# Altium schematic symbol library con-molex.SCHLIB: 368 symbols (part 1 of 6) (continued)
## 53?-13398
designator X?, comment CONNECTOR   wire to board 1.25 mm (.049 inch) pitch header
OC_FARNELL: unknown; OC_NEWARK: unknown
footprint 53398-13
part A pins: 1 S
part B pins: 2 S
part C pins: 3 S
part D pins: 4 S
part E pins: 5 S
part F pins: 6 S
part G pins: 7 S
part H pins: 8 S
part I pins: 9 S
part J pins: 10 S
part K pins: 11 S
part L pins: 12 S
part M pins: 13 S

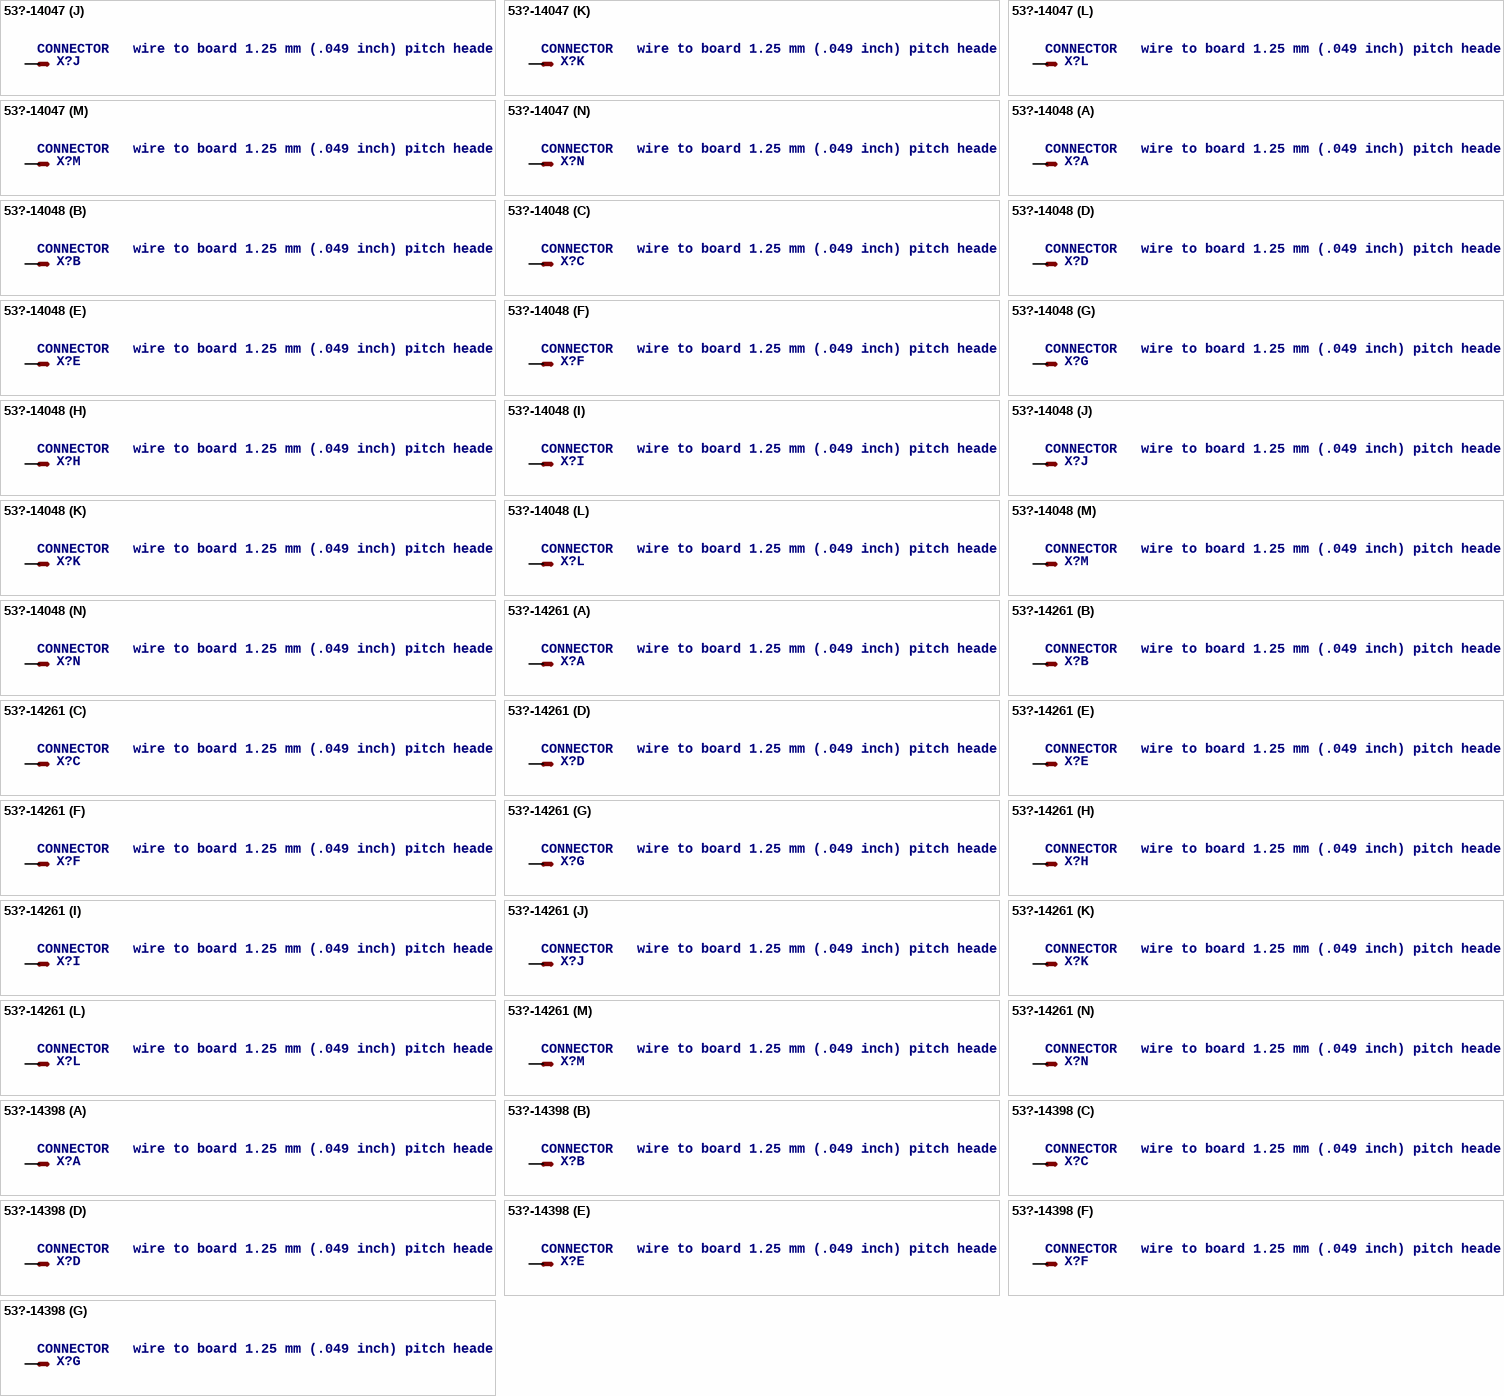
[diagram p15: symbols 53?-14047 to 53?-14398]

## 53?-14047
designator X?, comment CONNECTOR   wire to board 1.25 mm (.049 inch) pitch header
MPN: 53047-1410; OC_FARNELL: 9732900; OC_NEWARK: 98K9830
footprint 53047-14
part A pins: 1 S
part B pins: 2 S
part C pins: 3 S
part D pins: 4 S
part E pins: 5 S
part F pins: 6 S
part G pins: 7 S
part H pins: 8 S
part I pins: 9 S
part J pins: 10 S
part K pins: 11 S
part L pins: 12 S
part M pins: 13 S
part N pins: 14 S

## 53?-14048
designator X?, comment CONNECTOR   wire to board 1.25 mm (.049 inch) pitch header
MPN: 53048-1410; OC_FARNELL: 1012240; OC_NEWARK: 98K9839
footprint 53048-14
part A pins: 1 S
part B pins: 2 S
part C pins: 3 S
part D pins: 4 S
part E pins: 5 S
part F pins: 6 S
part G pins: 7 S
part H pins: 8 S
part I pins: 9 S
part J pins: 10 S
part K pins: 11 S
part L pins: 12 S
part M pins: 13 S
part N pins: 14 S

## 53?-14261
designator X?, comment CONNECTOR   wire to board 1.25 mm (.049 inch) pitch header
OC_FARNELL: 1125364; OC_NEWARK: unknown
footprint 53261-14
part A pins: 1 S
part B pins: 2 S
part C pins: 3 S
part D pins: 4 S
part E pins: 5 S
part F pins: 6 S
part G pins: 7 S
part H pins: 8 S
part I pins: 9 S
part J pins: 10 S
part K pins: 11 S
part L pins: 12 S
part M pins: 13 S
part N pins: 14 S

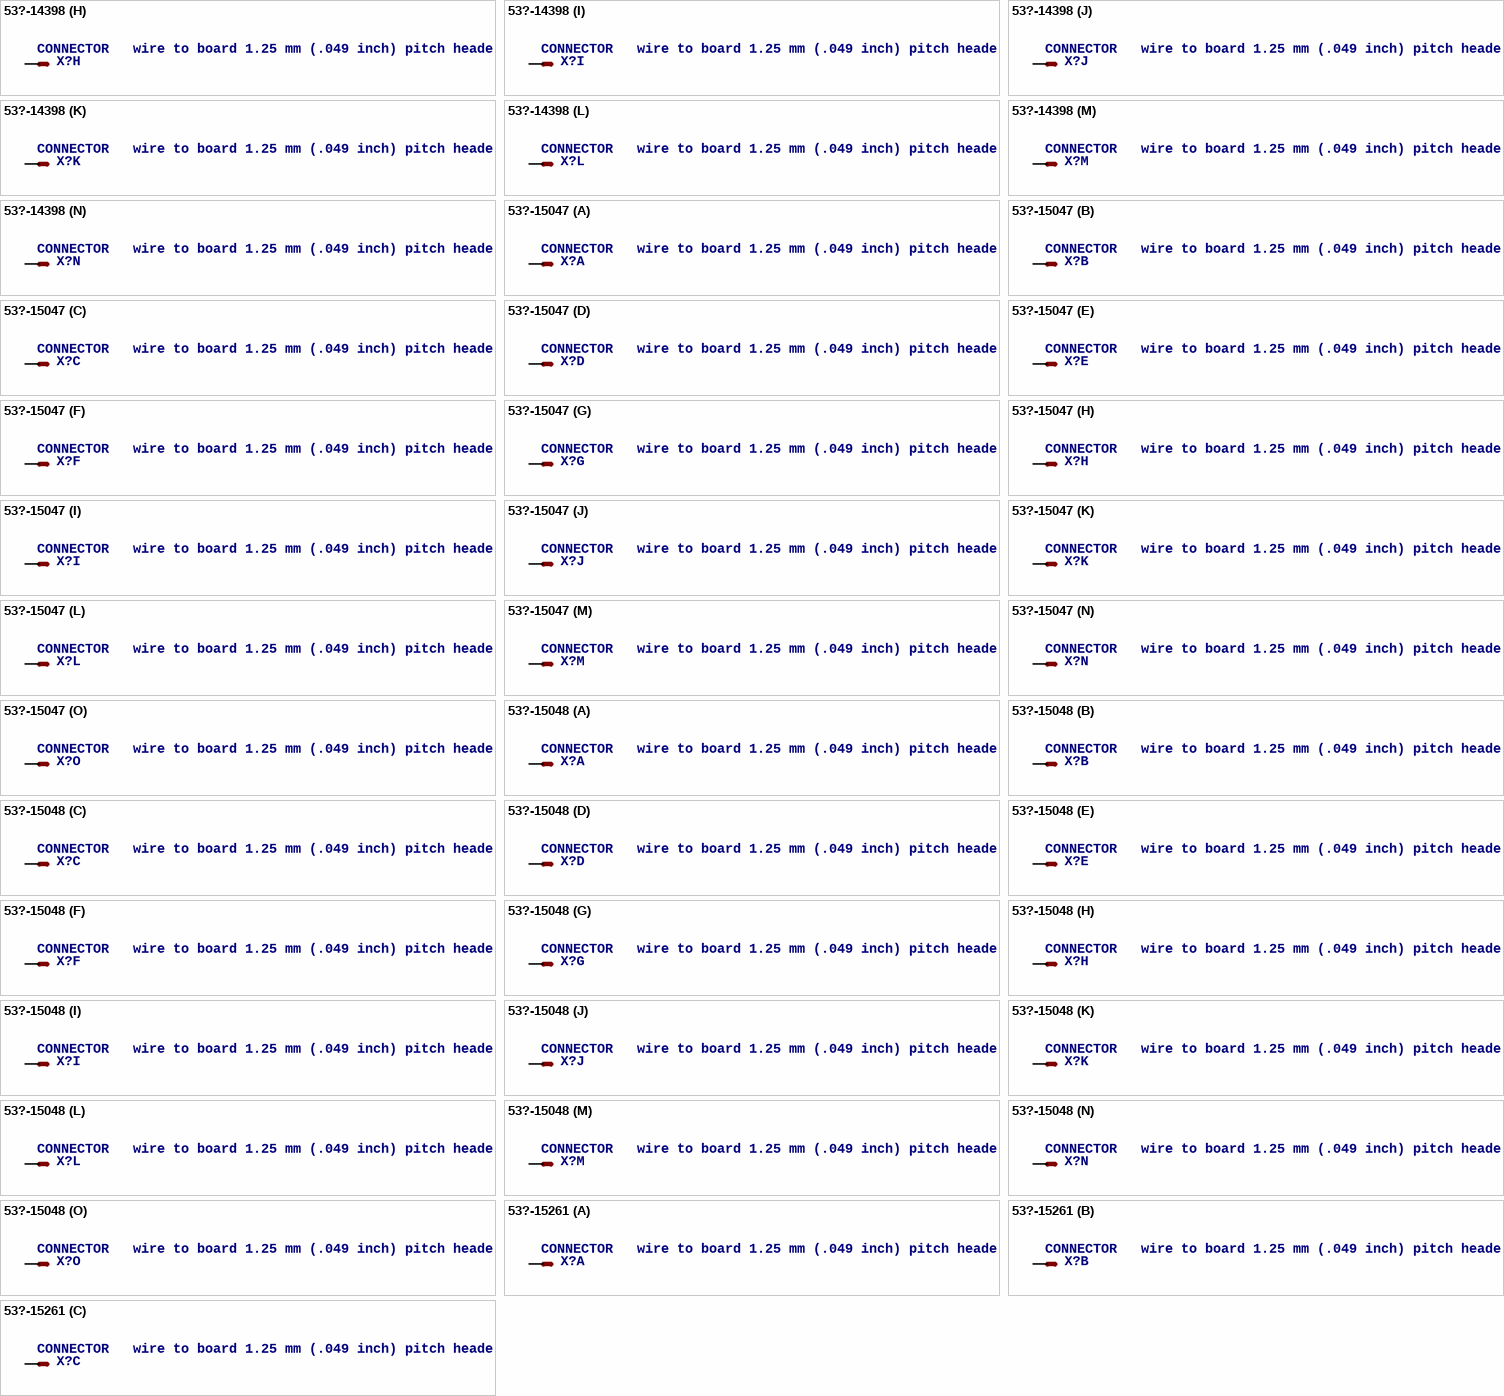
[diagram p16: symbols 53?-14398 to 53?-15261]

## 53?-14398
designator X?, comment CONNECTOR   wire to board 1.25 mm (.049 inch) pitch header
OC_FARNELL: 9786384; OC_NEWARK: unknown
footprint 53398-14
part A pins: 1 S
part B pins: 2 S
part C pins: 3 S
part D pins: 4 S
part E pins: 5 S
part F pins: 6 S
part G pins: 7 S
part H pins: 8 S
part I pins: 9 S
part J pins: 10 S
part K pins: 11 S
part L pins: 12 S
part M pins: 13 S
part N pins: 14 S

## 53?-15047
designator X?, comment CONNECTOR   wire to board 1.25 mm (.049 inch) pitch header
MPN: 53047-1510-C; OC_FARNELL: unknown; OC_NEWARK: 79K4146
footprint 53047-15
part A pins: 1 S
part B pins: 2 S
part C pins: 3 S
part D pins: 4 S
part E pins: 5 S
part F pins: 6 S
part G pins: 7 S
part H pins: 8 S
part I pins: 9 S
part J pins: 10 S
part K pins: 11 S
part L pins: 12 S
part M pins: 13 S
part N pins: 14 S
part O pins: 15 S

## 53?-15048
designator X?, comment CONNECTOR   wire to board 1.25 mm (.049 inch) pitch header
MPN: 53048-1510; OC_FARNELL: 9732942; OC_NEWARK: 98K9840
footprint 53048-15
part A pins: 1 S
part B pins: 2 S
part C pins: 3 S
part D pins: 4 S
part E pins: 5 S
part F pins: 6 S
part G pins: 7 S
part H pins: 8 S
part I pins: 9 S
part J pins: 10 S
part K pins: 11 S
part L pins: 12 S
part M pins: 13 S
part N pins: 14 S
part O pins: 15 S

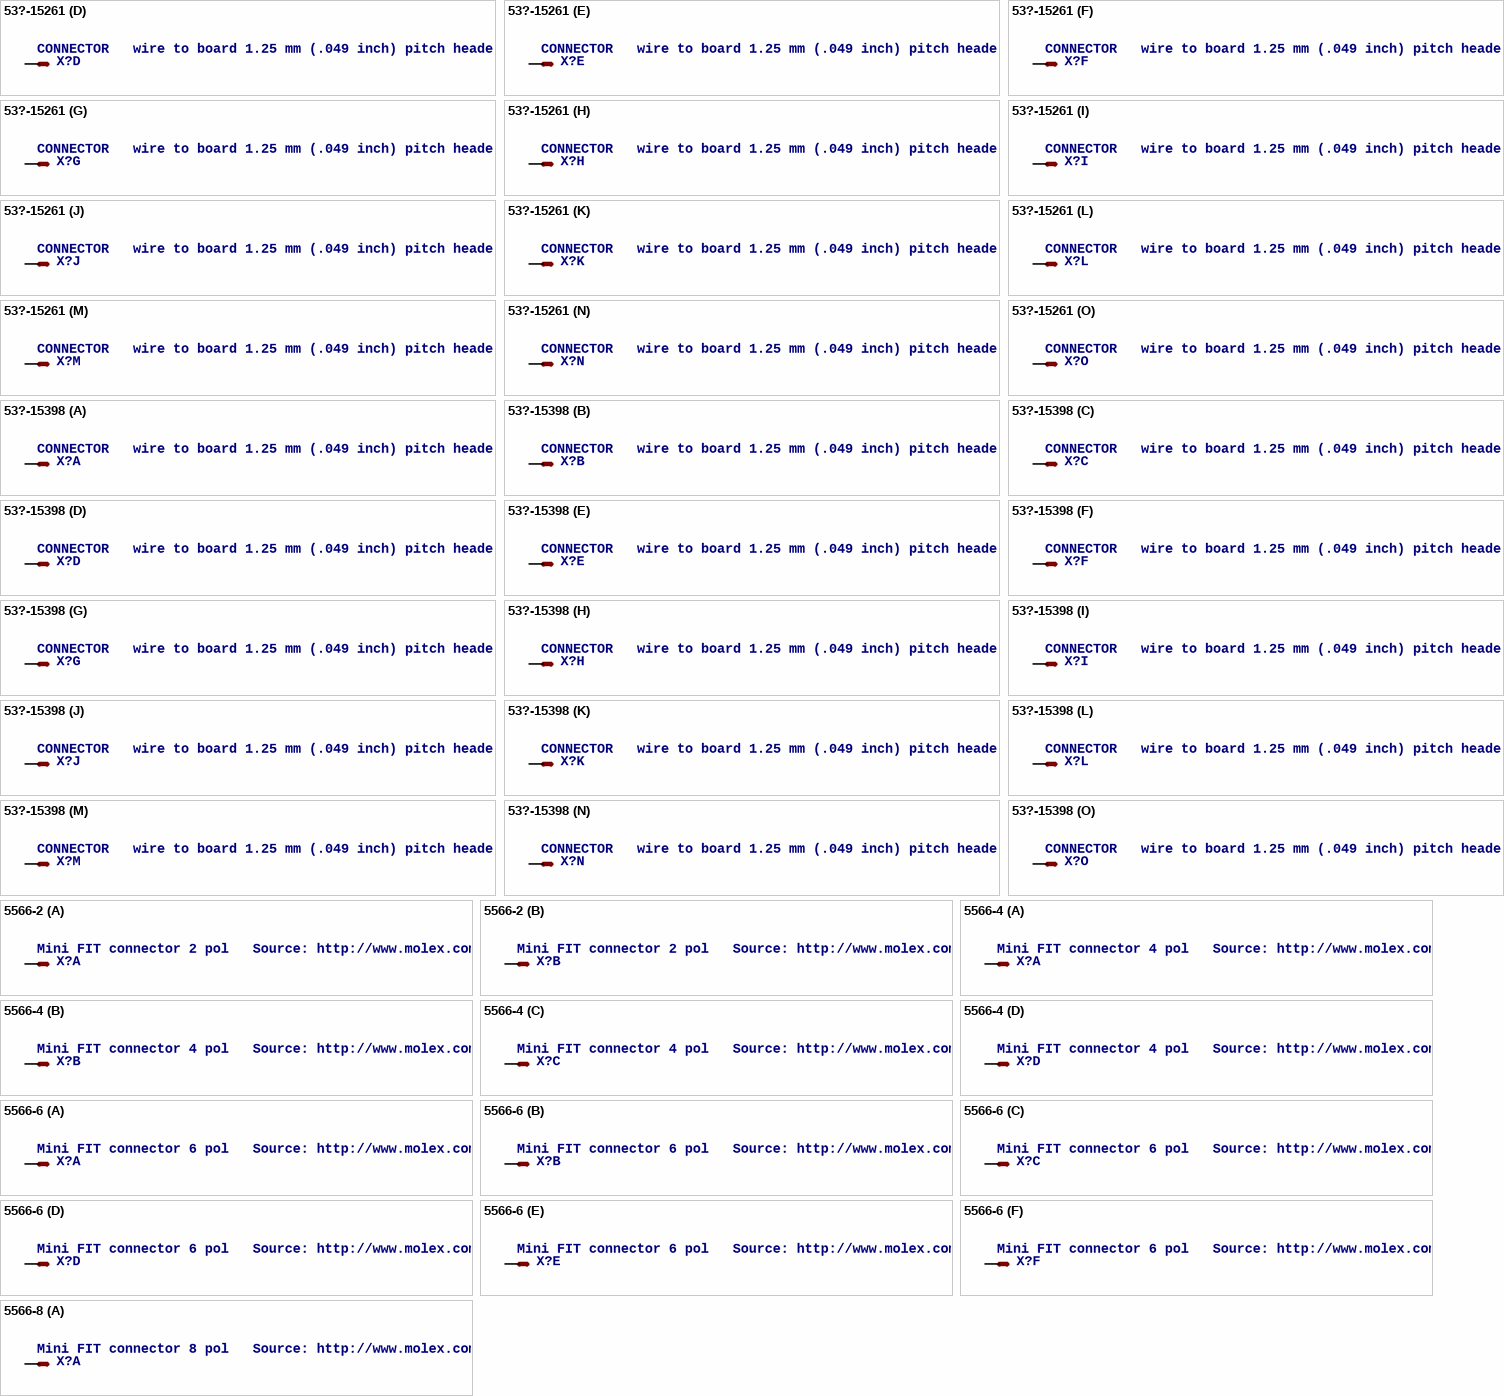
[diagram p17: symbols 53?-15261 to 5566-8]

## 53?-15261
designator X?, comment CONNECTOR   wire to board 1.25 mm (.049 inch) pitch header
OC_FARNELL: 1125365; OC_NEWARK: unknown
footprint 53261-15
part A pins: 1 S
part B pins: 2 S
part C pins: 3 S
part D pins: 4 S
part E pins: 5 S
part F pins: 6 S
part G pins: 7 S
part H pins: 8 S
part I pins: 9 S
part J pins: 10 S
part K pins: 11 S
part L pins: 12 S
part M pins: 13 S
part N pins: 14 S
part O pins: 15 S

## 53?-15398
designator X?, comment CONNECTOR   wire to board 1.25 mm (.049 inch) pitch header
MPN: 53398-1590; MF: MOLEX; OC_FARNELL: 1125358; OC_NEWARK: 57H5433
footprint 53398-15
part A pins: 1 S
part B pins: 2 S
part C pins: 3 S
part D pins: 4 S
part E pins: 5 S
part F pins: 6 S
part G pins: 7 S
part H pins: 8 S
part I pins: 9 S
part J pins: 10 S
part K pins: 11 S
part L pins: 12 S
part M pins: 13 S
part N pins: 14 S
part O pins: 15 S

## 5566-2
designator X?, comment Mini FIT connector 2 pol   Source: http://www.molex.com
OC_FARNELL: 1822072; OC_NEWARK: unknown
footprint 5566-2
part A pins: 1 S
part B pins: 2 S

## 5566-4
designator X?, comment Mini FIT connector 4 pol   Source: http://www.molex.com
OC_FARNELL: unknown; OC_NEWARK: unknown
footprint 5566-4
part A pins: 1 S
part B pins: 2 S
part C pins: 3 S
part D pins: 4 S

## 5566-6
designator X?, comment Mini FIT connector 6 pol   Source: http://www.molex.com
MPN: 95566-61002; OC_FARNELL: unknown; OC_NEWARK: 22K8620
footprint 5566-6
part A pins: 1 S
part B pins: 2 S
part C pins: 3 S
part D pins: 4 S
part E pins: 5 S
part F pins: 6 S

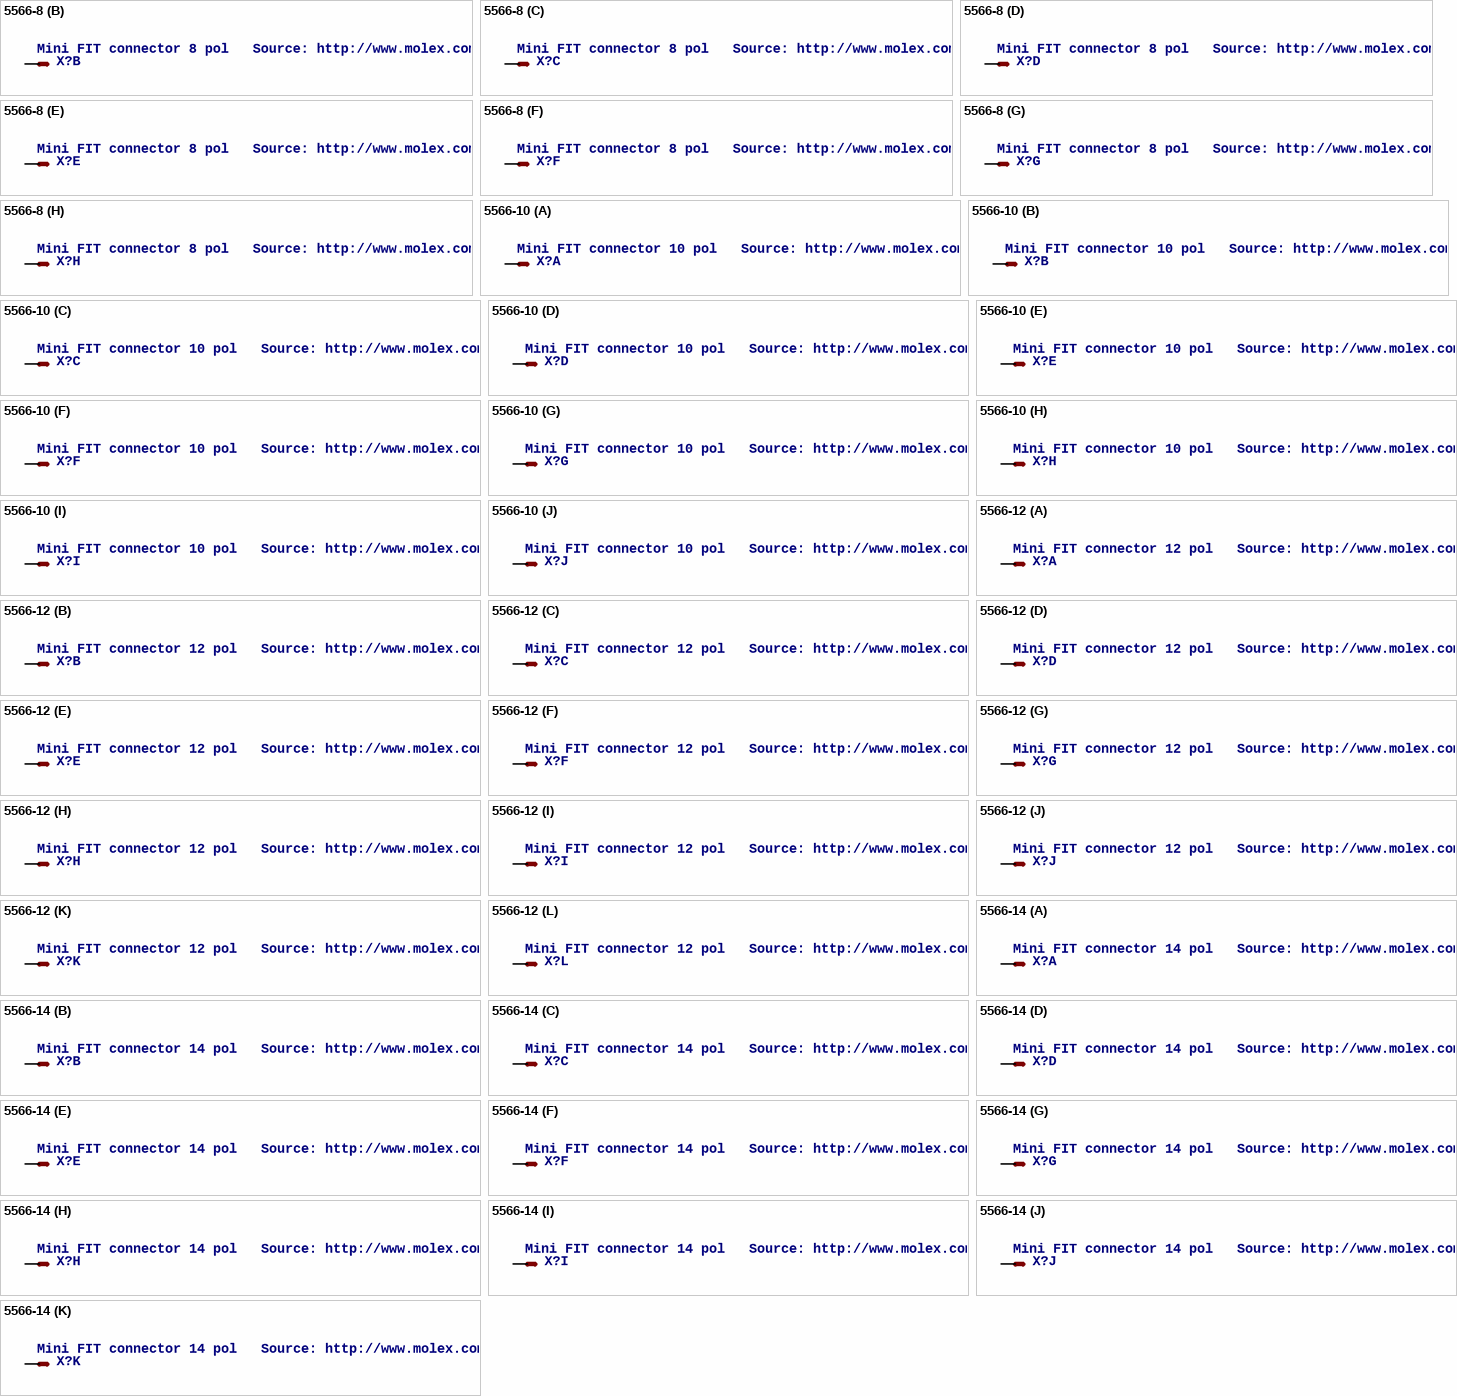
[diagram p18: symbols 5566-8 to 5566-14]

## 5566-8
designator X?, comment Mini FIT connector 8 pol   Source: http://www.molex.com
OC_FARNELL: unknown; OC_NEWARK: unknown
footprint 5566-8
part A pins: 1 S
part B pins: 2 S
part C pins: 3 S
part D pins: 4 S
part E pins: 5 S
part F pins: 6 S
part G pins: 7 S
part H pins: 8 S

## 5566-10
designator X?, comment Mini FIT connector 10 pol   Source: http://www.molex.com
OC_FARNELL: unknown; OC_NEWARK: unknown
footprint 5566-10
part A pins: 1 S
part B pins: 2 S
part C pins: 3 S
part D pins: 4 S
part E pins: 5 S
part F pins: 6 S
part G pins: 7 S
part H pins: 8 S
part I pins: 9 S
part J pins: 10 S

## 5566-12
designator X?, comment Mini FIT connector 12 pol   Source: http://www.molex.com
OC_FARNELL: unknown; OC_NEWARK: unknown
footprint 5566-12
part A pins: 1 S
part B pins: 2 S
part C pins: 3 S
part D pins: 4 S
part E pins: 5 S
part F pins: 6 S
part G pins: 7 S
part H pins: 8 S
part I pins: 9 S
part J pins: 10 S
part K pins: 11 S
part L pins: 12 S

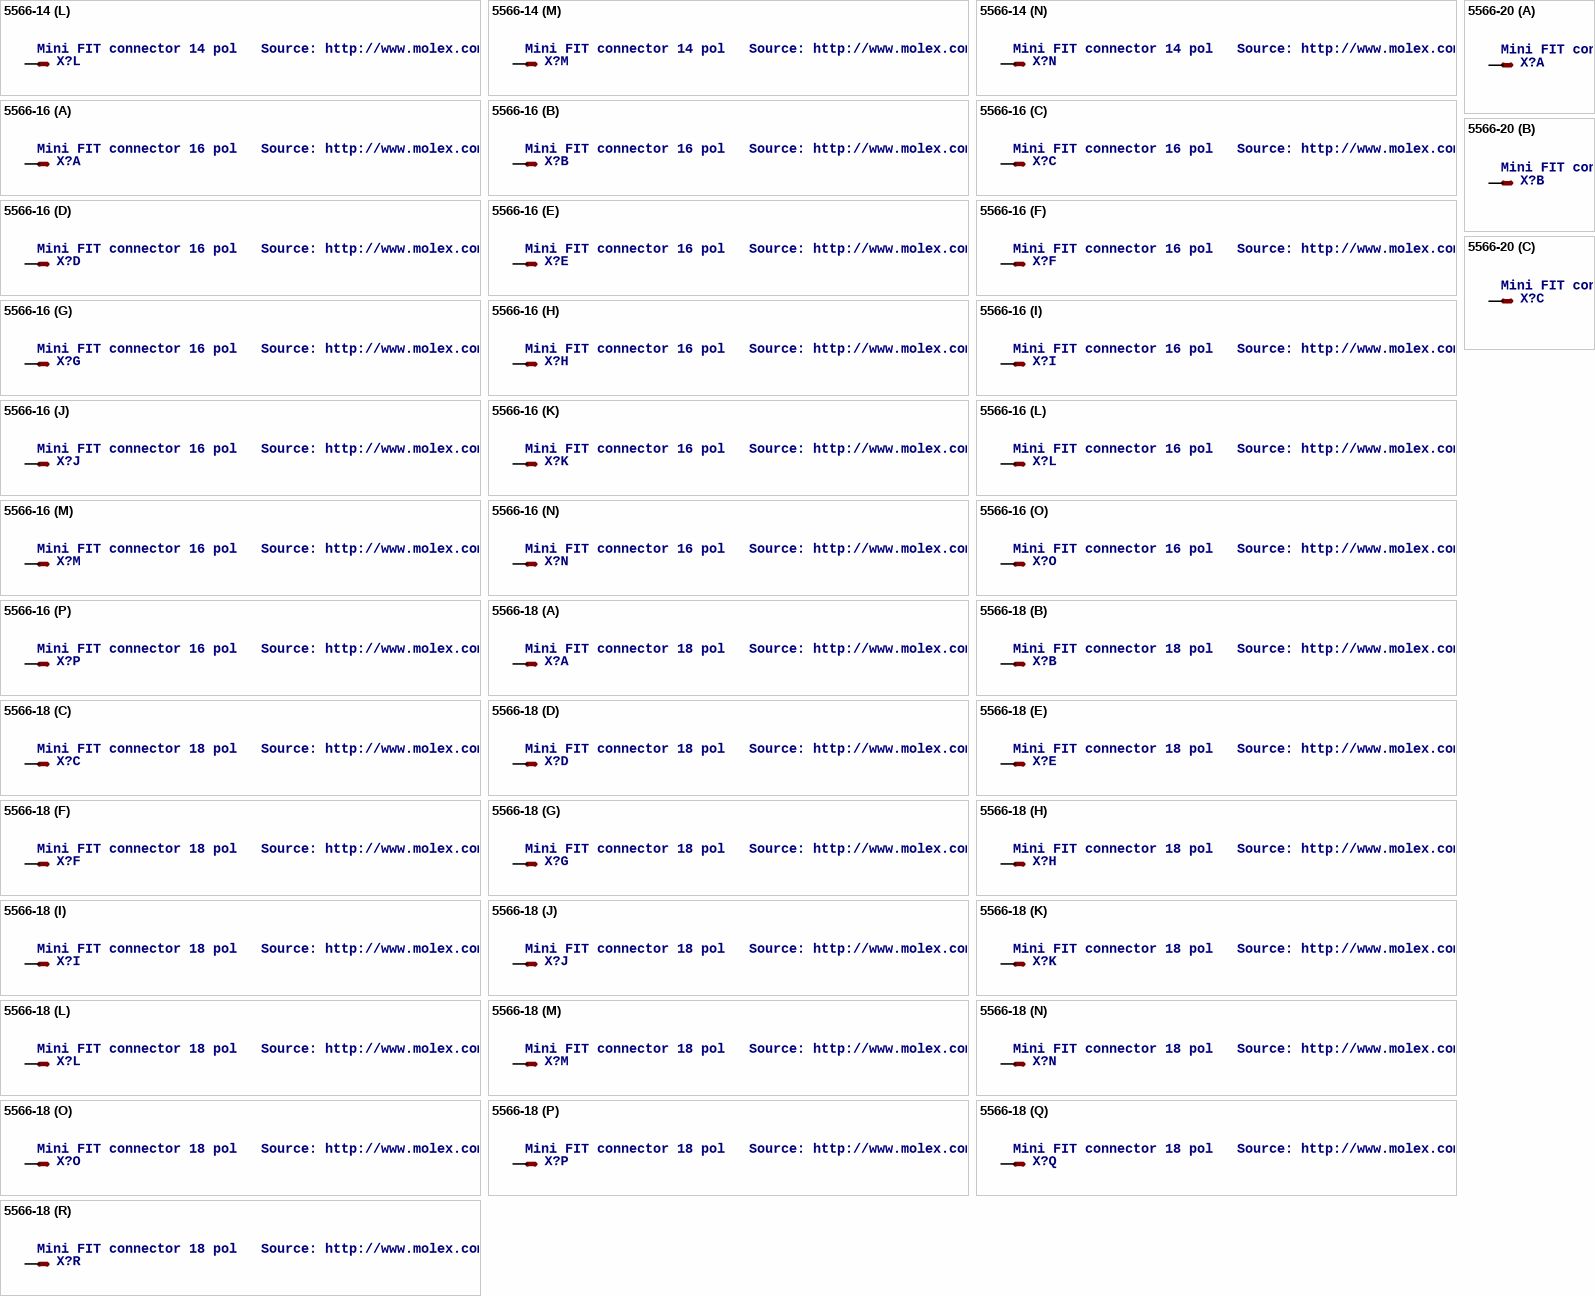
[diagram p19: symbols 5566-14 to 5566-20]

## 5566-14
designator X?, comment Mini FIT connector 14 pol   Source: http://www.molex.com
OC_FARNELL: unknown; OC_NEWARK: unknown
footprint 5566-14
part A pins: 1 S
part B pins: 2 S
part C pins: 3 S
part D pins: 4 S
part E pins: 5 S
part F pins: 6 S
part G pins: 7 S
part H pins: 8 S
part I pins: 9 S
part J pins: 10 S
part K pins: 11 S
part L pins: 12 S
part M pins: 13 S
part N pins: 14 S

## 5566-16
designator X?, comment Mini FIT connector 16 pol   Source: http://www.molex.com
OC_FARNELL: unknown; OC_NEWARK: unknown
footprint 5566-16
part A pins: 1 S
part B pins: 2 S
part C pins: 3 S
part D pins: 4 S
part E pins: 5 S
part F pins: 6 S
part G pins: 7 S
part H pins: 8 S
part I pins: 9 S
part J pins: 10 S
part K pins: 11 S
part L pins: 12 S
part M pins: 13 S
part N pins: 14 S
part O pins: 15 S
part P pins: 16 S

## 5566-18
designator X?, comment Mini FIT connector 18 pol   Source: http://www.molex.com
OC_FARNELL: unknown; OC_NEWARK: unknown
footprint 5566-18
part A pins: 1 S
part B pins: 2 S
part C pins: 3 S
part D pins: 4 S
part E pins: 5 S
part F pins: 6 S
part G pins: 7 S
part H pins: 8 S
part I pins: 9 S
part J pins: 10 S
part K pins: 11 S
part L pins: 12 S
part M pins: 13 S
part N pins: 14 S
part O pins: 15 S
part P pins: 16 S
part Q pins: 17 S
part R pins: 18 S

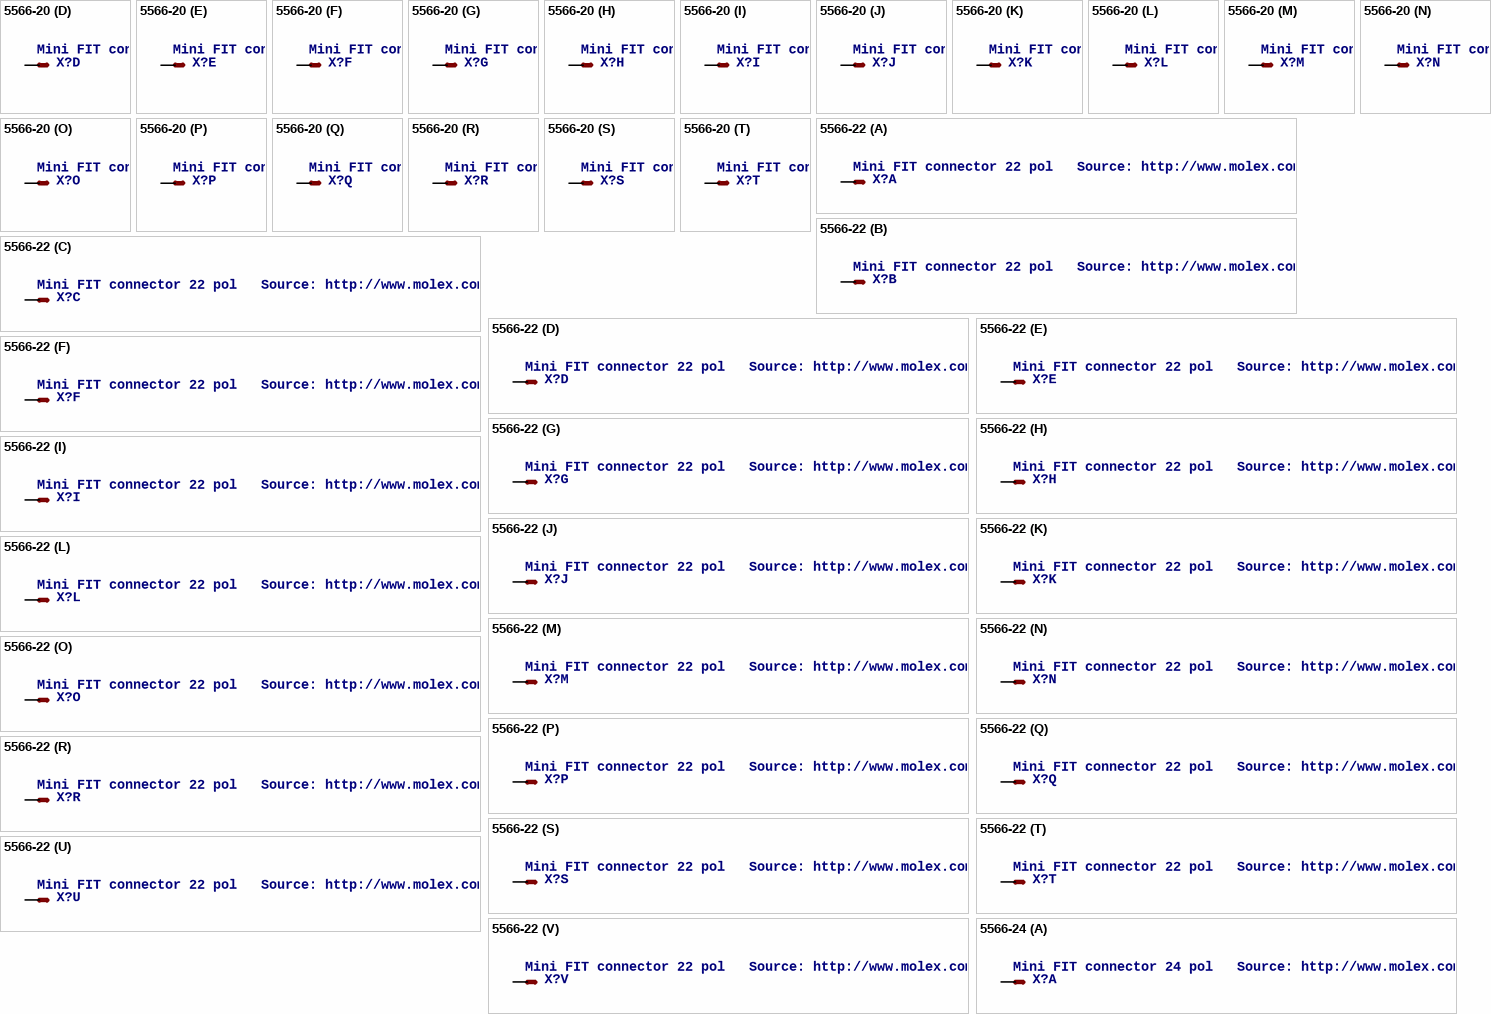
[diagram p20: symbols 5566-20 to 5566-24]

## 5566-20
designator X?, comment Mini FIT connector 20 pol   ATX PC-Motherboard Power connector Source: http://www.molex.com
OC_FARNELL: unknown; OC_NEWARK: unknown
footprint 5566-20
part A pins: 1 S
part B pins: 2 S
part C pins: 3 S
part D pins: 4 S
part E pins: 5 S
part F pins: 6 S
part G pins: 7 S
part H pins: 8 S
part I pins: 9 S
part J pins: 10 S
part K pins: 11 S
part L pins: 12 S
part M pins: 13 S
part N pins: 14 S
part O pins: 15 S
part P pins: 16 S
part Q pins: 17 S
part R pins: 18 S
part S pins: 19 S
part T pins: 20 S

## 5566-22
designator X?, comment Mini FIT connector 22 pol   Source: http://www.molex.com
OC_FARNELL: unknown; OC_NEWARK: unknown
footprint 5566-22
part A pins: 1 S
part B pins: 2 S
part C pins: 3 S
part D pins: 4 S
part E pins: 5 S
part F pins: 6 S
part G pins: 7 S
part H pins: 8 S
part I pins: 9 S
part J pins: 10 S
part K pins: 11 S
part L pins: 12 S
part M pins: 13 S
part N pins: 14 S
part O pins: 15 S
part P pins: 16 S
part Q pins: 17 S
part R pins: 18 S
part S pins: 19 S
part T pins: 20 S
part U pins: 21 S
part V pins: 22 S

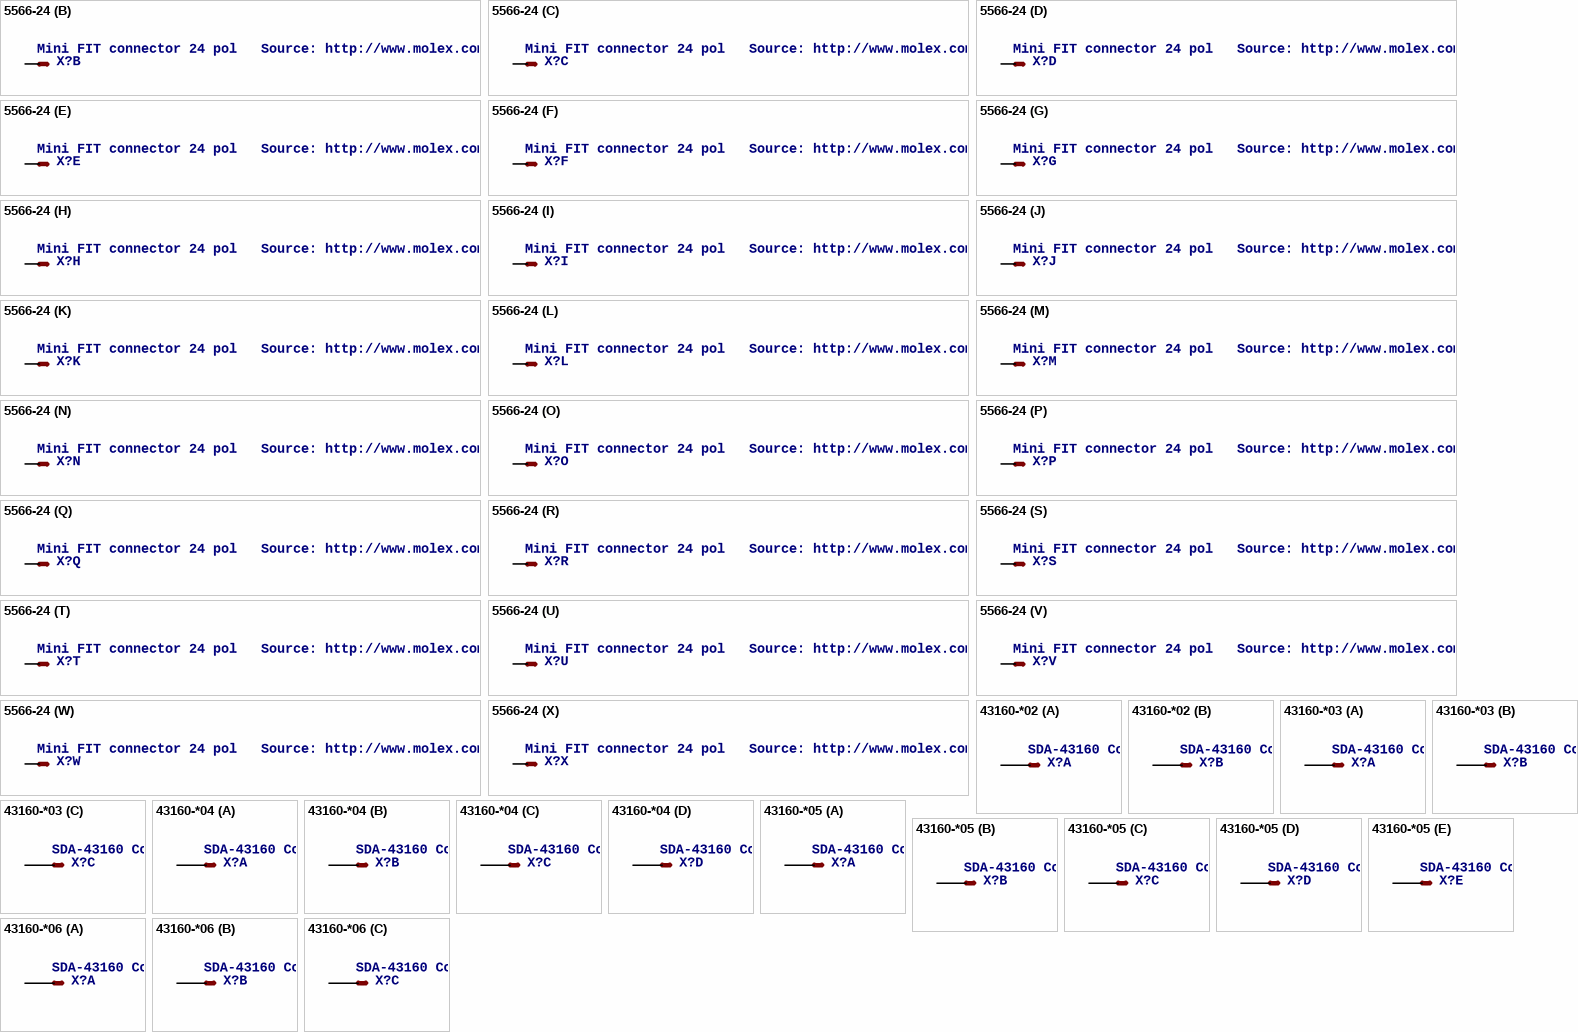
[diagram p21: symbols 5566-24 to 43160-*06]

## 5566-24
designator X?, comment Mini FIT connector 24 pol   Source: http://www.molex.com
OC_FARNELL: unknown; OC_NEWARK: unknown
footprint 5566-24
part A pins: 1 S
part B pins: 2 S
part C pins: 3 S
part D pins: 4 S
part E pins: 5 S
part F pins: 6 S
part G pins: 7 S
part H pins: 8 S
part I pins: 9 S
part J pins: 10 S
part K pins: 11 S
part L pins: 12 S
part M pins: 13 S
part N pins: 14 S
part O pins: 15 S
part P pins: 16 S
part Q pins: 17 S
part R pins: 18 S
part S pins: 19 S
part T pins: 20 S
part U pins: 21 S
part V pins: 22 S
part W pins: 23 S
part X pins: 24 S

## 43160-*02
designator X?, comment SDA-43160 Connector   Source: http://www.molex.com/pdm_docs/sd/431601306_sd.pdf
MPN: 43160-1102; MPN: 43160-1302; MPN: 43160-3102; MPN: 43160-5102; MPN: 43160-5302; MPN: 43160-7302; MF: WALDOM/MOLEX; OC_FARNELL: unknown; OC_NEWARK: 54H0255; OC_NEWARK: unknown; OC_NEWARK: 92M1480; OC_FARNELL: 3293038; OC_NEWARK: 54H0264; OC_NEWARK: 92M1493; OC_NEWARK: 92M1498; OC_NEWARK: 92M1507
footprint 43160-XX02
part A pins: 1@1 S@1, 1@2 S@2
part B pins: 2@1 S@1, 2@2 S@2

## 43160-*03
designator X?, comment SDA-43160 Connector   Source: http://www.molex.com/pdm_docs/sd/431601306_sd.pdf
MPN: 43160-1303; MPN: 43160-3103; MPN: 43160-5103; MPN: 43160-5303; MPN: 43160-7303; MF: WALDOM/MOLEX; OC_FARNELL: unknown; OC_NEWARK: unknown; OC_NEWARK: 92M1481; OC_FARNELL: 3293040; OC_NEWARK: 54H0265; OC_NEWARK: 92M1494; OC_NEWARK: 92M1499; OC_NEWARK: 92M1508
footprint 43160-XX03
part A pins: 1@1 S@1, 1@2 S@2
part B pins: 2@1 S@1, 2@2 S@2
part C pins: 3@1 S@1, 3@2 S@2

## 43160-*04
designator X?, comment SDA-43160 Connector   Source: http://www.molex.com/pdm_docs/sd/431601306_sd.pdf
MPN: 43160-1104; MPN: 43160-1304; MPN: 43160-3104; MPN: 43160-5104; MPN: 43160-5304; MPN: 43160-7304; MF: WALDOM/MOLEX; MF: FARNELL; OC_FARNELL: unknown; OC_NEWARK: 54H0257; OC_NEWARK: unknown; OC_NEWARK: 92M1482; OC_FARNELL: 3293051; OC_NEWARK: 19J5462; OC_NEWARK: 92M1495; OC_NEWARK: 92M1500; OC_NEWARK: 92M1509
footprint 43160-XX04
part A pins: 1@1 S@1, 1@2 S@2
part B pins: 2@1 S@1, 2@2 S@2
part C pins: 3@1 S@1, 3@2 S@2
part D pins: 4@1 S@1, 4@2 S@2

## 43160-*05
designator X?, comment SDA-43160 Connector   Source: http://www.molex.com/pdm_docs/sd/431601306_sd.pdf
MPN: 43160-1105; MPN: 43160-1305; MPN: 43160-3105; MPN: 43160-5105; MPN: 43160-5305; MPN: 43160-7305; MF: WALDOM/MOLEX; OC_FARNELL: unknown; OC_NEWARK: 54H0258; OC_NEWARK: unknown; OC_NEWARK: 92M1483; OC_NEWARK: 54H0267; OC_NEWARK: 92M1496; OC_NEWARK: 92M1501; OC_NEWARK: 92M1510
footprint 43160-XX05
part A pins: 1@1 S@1, 1@2 S@2
part B pins: 2@1 S@1, 2@2 S@2
part C pins: 3@1 S@1, 3@2 S@2
part D pins: 4@1 S@1, 4@2 S@2
part E pins: 5@1 S@1, 5@2 S@2

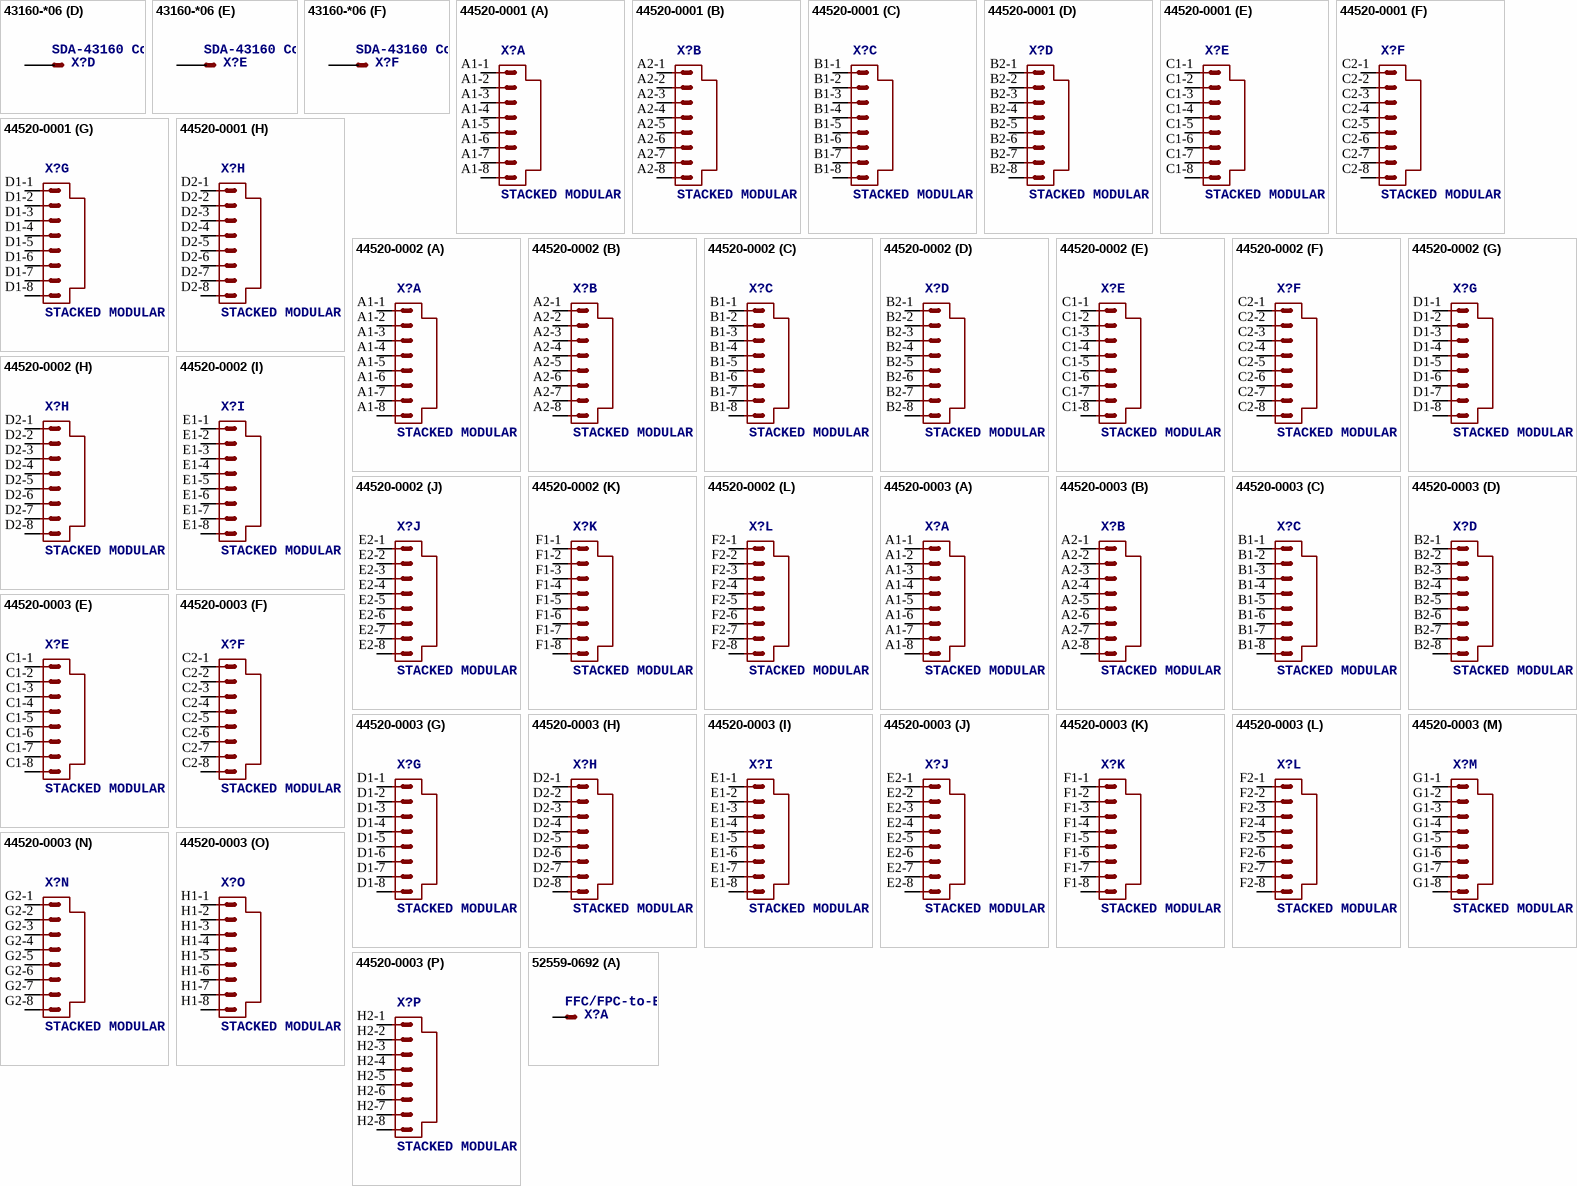
[diagram p22: symbols 43160-*06 to 52559-0692]

## 43160-*06
designator X?, comment SDA-43160 Connector   Source: http://www.molex.com/pdm_docs/sd/431601306_sd.pdf
MPN: 43160-1106; MPN: 43160-1306; MPN: 43160-3106; MPN: 43160-5106; MPN: 43160-5306; MPN: 43160-7306; MF: WALDOM/MOLEX; OC_FARNELL: unknown; OC_NEWARK: 54H0259; OC_NEWARK: unknown; OC_NEWARK: 92M1484; OC_FARNELL: 3293075; OC_NEWARK: 54H0268; OC_NEWARK: 92M1497; OC_NEWARK: 92M1502; OC_NEWARK: 92M1511
footprint 43160-XX06
part A pins: 1@1 S@1, 1@2 S@2
part B pins: 2@1 S@1, 2@2 S@2
part C pins: 3@1 S@1, 3@2 S@2
part D pins: 4@1 S@1, 4@2 S@2
part E pins: 5@1 S@1, 5@2 S@2
part F pins: 6@1 S@1, 6@2 S@2

## 44520-0001
designator X?, comment STACKED MODULAR JACK CATEGORY 5   Source: http://www.molex.com/pdm_docs/sd/445200006_sd.pdf
MPN: 44520-0001; OC_FARNELL: unknown; OC_NEWARK: 92C1819
footprint 44520-0001
part A pins: A1-1 1, A1-2 2, A1-3 3, A1-4 4, A1-5 5, A1-6 6, A1-7 7, A1-8 8
part B pins: A2-1 1, A2-2 2, A2-3 3, A2-4 4, A2-5 5, A2-6 6, A2-7 7, A2-8 8
part C pins: B1-1 1, B1-2 2, B1-3 3, B1-4 4, B1-5 5, B1-6 6, B1-7 7, B1-8 8
part D pins: B2-1 1, B2-2 2, B2-3 3, B2-4 4, B2-5 5, B2-6 6, B2-7 7, B2-8 8
part E pins: C1-1 1, C1-2 2, C1-3 3, C1-4 4, C1-5 5, C1-6 6, C1-7 7, C1-8 8
part F pins: C2-1 1, C2-2 2, C2-3 3, C2-4 4, C2-5 5, C2-6 6, C2-7 7, C2-8 8
part G pins: D1-1 1, D1-2 2, D1-3 3, D1-4 4, D1-5 5, D1-6 6, D1-7 7, D1-8 8
part H pins: D2-1 1, D2-2 2, D2-3 3, D2-4 4, D2-5 5, D2-6 6, D2-7 7, D2-8 8

## 44520-0002
designator X?, comment STACKED MODULAR JACK CATEGORY 5   Source: http://www.molex.com/pdm_docs/sd/445200006_sd.pdf
MPN: 44520-0002; OC_FARNELL: unknown; OC_NEWARK: 92M2840
footprint 44520-0002
part A pins: A1-1 1, A1-2 2, A1-3 3, A1-4 4, A1-5 5, A1-6 6, A1-7 7, A1-8 8
part B pins: A2-1 1, A2-2 2, A2-3 3, A2-4 4, A2-5 5, A2-6 6, A2-7 7, A2-8 8
part C pins: B1-1 1, B1-2 2, B1-3 3, B1-4 4, B1-5 5, B1-6 6, B1-7 7, B1-8 8
part D pins: B2-1 1, B2-2 2, B2-3 3, B2-4 4, B2-5 5, B2-6 6, B2-7 7, B2-8 8
part E pins: C1-1 1, C1-2 2, C1-3 3, C1-4 4, C1-5 5, C1-6 6, C1-7 7, C1-8 8
part F pins: C2-1 1, C2-2 2, C2-3 3, C2-4 4, C2-5 5, C2-6 6, C2-7 7, C2-8 8
part G pins: D1-1 1, D1-2 2, D1-3 3, D1-4 4, D1-5 5, D1-6 6, D1-7 7, D1-8 8
part H pins: D2-1 1, D2-2 2, D2-3 3, D2-4 4, D2-5 5, D2-6 6, D2-7 7, D2-8 8
part I pins: E1-1 1, E1-2 2, E1-3 3, E1-4 4, E1-5 5, E1-6 6, E1-7 7, E1-8 8
part J pins: E2-1 1, E2-2 2, E2-3 3, E2-4 4, E2-5 5, E2-6 6, E2-7 7, E2-8 8
part K pins: F1-1 1, F1-2 2, F1-3 3, F1-4 4, F1-5 5, F1-6 6, F1-7 7, F1-8 8
part L pins: F2-1 1, F2-2 2, F2-3 3, F2-4 4, F2-5 5, F2-6 6, F2-7 7, F2-8 8

## 44520-0003
designator X?, comment STACKED MODULAR JACK CATEGORY 5   Source: http://www.molex.com/pdm_docs/sd/445200006_sd.pdf
MPN: 44520-0003; OC_FARNELL: unknown; OC_NEWARK: 92M2841
footprint 44520-0003
part A pins: A1-1 1, A1-2 2, A1-3 3, A1-4 4, A1-5 5, A1-6 6, A1-7 7, A1-8 8
part B pins: A2-1 1, A2-2 2, A2-3 3, A2-4 4, A2-5 5, A2-6 6, A2-7 7, A2-8 8
part C pins: B1-1 1, B1-2 2, B1-3 3, B1-4 4, B1-5 5, B1-6 6, B1-7 7, B1-8 8
part D pins: B2-1 1, B2-2 2, B2-3 3, B2-4 4, B2-5 5, B2-6 6, B2-7 7, B2-8 8
part E pins: C1-1 1, C1-2 2, C1-3 3, C1-4 4, C1-5 5, C1-6 6, C1-7 7, C1-8 8
part F pins: C2-1 1, C2-2 2, C2-3 3, C2-4 4, C2-5 5, C2-6 6, C2-7 7, C2-8 8
part G pins: D1-1 1, D1-2 2, D1-3 3, D1-4 4, D1-5 5, D1-6 6, D1-7 7, D1-8 8
part H pins: D2-1 1, D2-2 2, D2-3 3, D2-4 4, D2-5 5, D2-6 6, D2-7 7, D2-8 8
part I pins: E1-1 1, E1-2 2, E1-3 3, E1-4 4, E1-5 5, E1-6 6, E1-7 7, E1-8 8
part J pins: E2-1 1, E2-2 2, E2-3 3, E2-4 4, E2-5 5, E2-6 6, E2-7 7, E2-8 8
part K pins: F1-1 1, F1-2 2, F1-3 3, F1-4 4, F1-5 5, F1-6 6, F1-7 7, F1-8 8
part L pins: F2-1 1, F2-2 2, F2-3 3, F2-4 4, F2-5 5, F2-6 6, F2-7 7, F2-8 8
part M pins: G1-1 1, G1-2 2, G1-3 3, G1-4 4, G1-5 5, G1-6 6, G1-7 7, G1-8 8
part N pins: G2-1 1, G2-2 2, G2-3 3, G2-4 4, G2-5 5, G2-6 6, G2-7 7, G2-8 8
part O pins: H1-1 1, H1-2 2, H1-3 3, H1-4 4, H1-5 5, H1-6 6, H1-7 7, H1-8 8
part P pins: H2-1 1, H2-2 2, H2-3 3, H2-4 4, H2-5 5, H2-6 6, H2-7 7, H2-8 8